# Altium footprint library Elettronica FM.PcbLib: 387 footprints (part 4 of 25)
Each footprint in its own frame and in the unit in brackets; x right, y up, seen from the top. Pads: shape width x height; smd on the part's side, far side on the other; paste and mask are expansions set on the pad; w line width, h text height; cw(c..) or ccw(c..) is an arc to the next point about the centre after c.
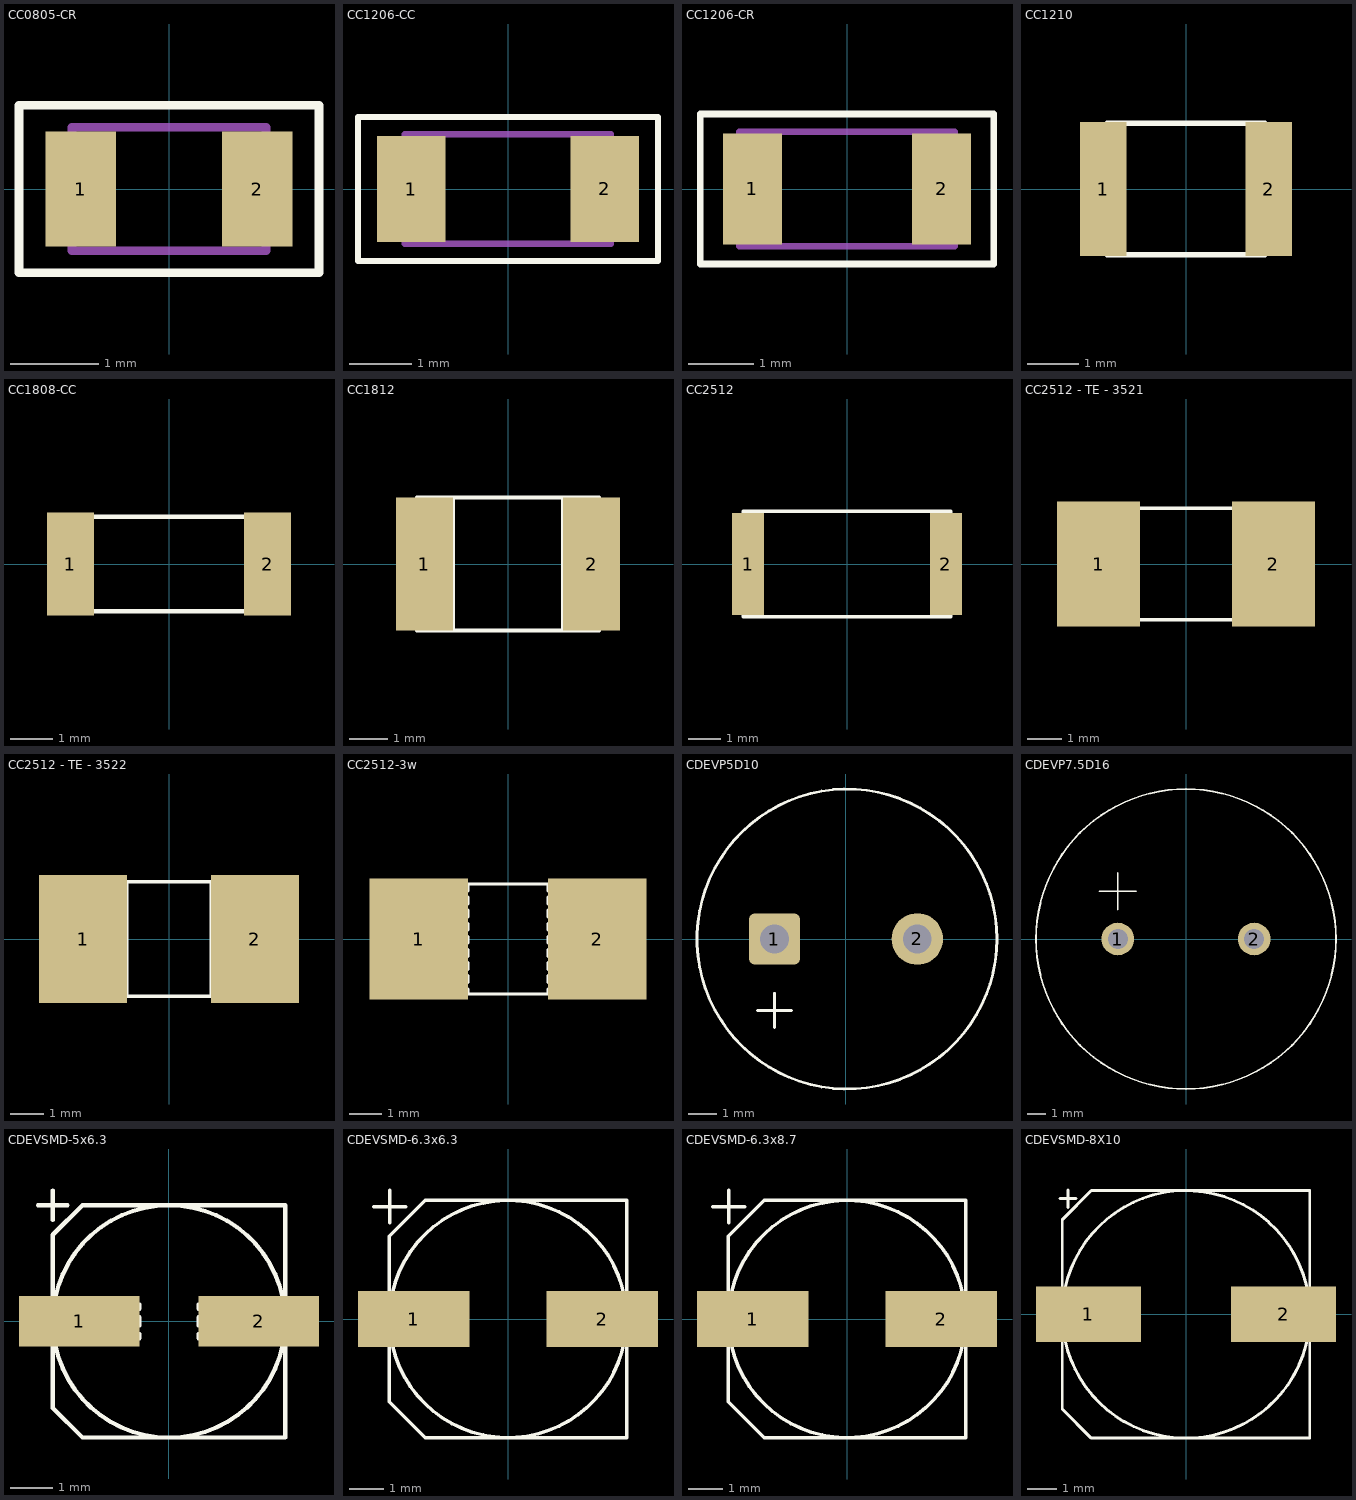
[diagram p3: the footprints below, top view; thin cyan lines are the x and y axes]

## CC0805-CR [mm]
height 1.9
pads (2):
  rect 0.8x1.3 smd paste-5: 1(-1,0) 2(1,0)
Top Overlay:
  lines w0.1: -1.7,-0.95 -1.7,0.95 1.7,0.95 1.7,-0.95 -1.7,-0.95
Top Paste:
  region: 1.35,0.6 0.9,0.6 0.65,0 0.9,-0.6 1.35,-0.6
  region: -1.35,0.6 -0.9,0.6 -0.65,0 -0.9,-0.6 -1.35,-0.6
Mechanical 3:
  lines w0.1: -1.1,-0.7 -1.1,0.7 1.1,0.7 1.1,-0.7 -1.1,-0.7
3D body "res0805.STEP": height 0.5, standoff 0, extent -1,-0.625 1,0.625

## CC1206-CC [mm]
height 1.9
pads (2):
  rect 1.1x1.7 smd paste-5: 1(-1.55,0) 2(1.55,0)
Top Overlay:
  lines w0.1: -2.4,-1.15 2.4,-1.15 2.4,1.15 -2.4,1.15 -2.4,-1.15
Top Paste:
  region: 2.05,0.8 1.3,0.8 1.05,0 1.3,-0.8 2.05,-0.8
  region: -2.05,0.8 -1.3,0.8 -1.05,0 -1.3,-0.8 -2.05,-0.8
Mechanical 3:
  lines w0.1: -1.65,-0.875 -1.65,0.875 1.65,0.875 1.65,-0.875 -1.65,-0.875
3D body "res1206r.STEP": height 0.55, standoff 0, extent -1.55,-0.8 1.55,0.8

## CC1206-CR [mm]
height 1.9
pads (2):
  rect 0.9x1.7 smd paste-5: 1(-1.45,0) 2(1.45,0)
Top Overlay:
  lines w0.1: -2.25,-1.15 -2.25,1.15 2.25,1.15 2.25,-1.15 -2.25,-1.15
Top Paste:
  region: 1.85,0.6 1.85,0.8 1.3,0.8 1.05,0 1.3,-0.8 1.85,-0.8 1.85,-0.6
  region: -1.85,0.6 -1.85,0.8 -1.3,0.8 -1.05,0 -1.3,-0.8 -1.85,-0.8 -1.85,-0.6
Mechanical 3:
  lines w0.1: -1.65,-0.875 1.65,-0.875 1.65,0.875 -1.65,0.875 -1.65,-0.875
3D body "res1206r.STEP": height 0.55, standoff 0, extent -1.525,-0.85 1.575,0.75

## CC1210 [mm]
pads (2):
  rect 0.9x2.6 smd: 1(-1.6,0) 2(1.6,0)
Top Overlay:
  lines w0.1: -1.525,-1.27 1.525,-1.27 1.525,1.27 -1.525,1.27 -1.525,-1.27

## CC1808-CC [mm]
pads (2):
  rect 1.1x2.4 smd: 1(-2.3,0) 2(2.3,0)
Top Overlay:
  lines w0.1: -2.1,-1.1 -2.1,1.1 ; 2.1,-1.1 2.1,1.1 ; -2.4,-1.1 2.4,-1.1 2.4,1.1 -2.4,1.1 -2.4,-1.1

## CC1812 [mm]
pads (2):
  rect 1.5x3.5 smd: 1(-2.2,0) 2(2.2,0)
Top Overlay:
  lines w0.1: -1.45,-1.75 -1.45,1.75 ; 1.45,-1.75 1.45,1.75 ; -2.4,-1.75 -2.4,1.75 2.4,1.75 2.4,-1.75 -2.4,-1.75

## CC2512 [mm]
pads (2):
  rect 1x3.2 smd: 1(-3.1,0) 2(3.1,0)
Top Overlay:
  lines w0.1: -3.25,-1.65 3.25,-1.65 3.25,1.65 -3.25,1.65 -3.25,-1.65

## CC2512 - TE - 3521 [mm]
pads (2):
  rect 2.45x3.7 smd: 1(-2.575,0) 2(2.575,0)
Top Overlay:
  lines w0.1: -3.25,-1.65 3.25,-1.65 3.25,1.65 -3.25,1.65 -3.25,-1.65

## CC2512 - TE - 3522 [mm]
pads (2):
  rect 2.6x3.8 smd: 1(-2.55,0) 2(2.55,0)
Top Overlay:
  lines w0.1: -1.25,-1.65 -1.25,1.65 ; 1.25,-1.65 1.25,1.65 ; -3.25,-1.7 3.25,-1.7 3.25,1.7 -3.25,1.7 -3.25,-1.7

## CC2512-3w [mm]
pads (2):
  rect 3x3.7 smd: 1(-2.725,0) 2(2.725,0)
Top Overlay:
  lines w0.1: -1.225,-1.675 -1.225,-1.525 ; -1.225,-1.325 -1.225,-1.125 ; -1.225,-0.925 -1.225,-0.725 ; -1.225,-0.525 -1.225,-0.325 ; -1.225,-0.125 -1.225,0.075 ; -1.225,0.275 -1.225,0.475 ; -1.225,0.675 -1.225,0.875 ; -1.225,1.075 -1.225,1.275 ; -1.225,1.475 -1.225,1.675 ; 1.225,-1.675 1.225,-1.525 ; 1.225,-1.325 1.225,-1.125 ; 1.225,-0.925 1.225,-0.725 ; 1.225,-0.525 1.225,-0.325 ; 1.225,-0.125 1.225,0.075 ; 1.225,0.275 1.225,0.475 ; 1.225,0.675 1.225,0.875 ; 1.225,1.075 1.225,1.275 ; 1.225,1.475 1.225,1.675 ; -3.225,-1.675 -3.225,1.675 3.225,1.675 3.225,-1.675 -3.225,-1.675

## CDEVP5D10 [mm]
height 8.5
pads (2):
  rrect25% 1.8x1.8 hole 1: 1(-2.5,0)
  round 1.8 hole 1: 2(2.5,0)
Top Overlay:
  circle w0.1: c0.038,0 r5.25
  lines w0.1: -3.1,-2.5 -1.9,-2.5 ; -2.5,-3.1 -2.5,-1.9
3D body: height 17.5, standoff 0, extent -5.25,-5.247 5.25,5.247

## CDEVP7.5D16 [mm]
height 40.5
pads (2):
  round 1.8 hole 1.1: 1(-3.75,0) 2(3.75,0)
Top Overlay:
  circle w0.1: c0,0 r8.25
  lines w0.1: -4.75,2.625 -2.75,2.625 ; -3.75,1.625 -3.75,3.625
3D body: height 0, standoff -3, extent 3.353,-0.399 4.15,0.399
3D body: height 0, standoff -3, extent -4.147,-0.399 -3.35,0.399
3D body: height 26.7, standoff -0.1, extent 6.3,-1 8.25,1
3D body: height 26.5, standoff 0, extent -8.25,-8.247 8.25,8.247
3D body: height 26.6, standoff -0.1, extent -6.3,-6.3 6.3,6.3

## CDEVSMD-5x6.3 [mm]
height 1.9
pads (2):
  rect 2.85x1.2 smd: 1(-2.125,0) 2(2.125,0)
Top Overlay:
  circle w0.1: c0,0 r2.75
  lines w0.1: -3.1,2.75 -2.4,2.75 ; -2.75,-0.4 -3.05,-0.4 -3.05,0.4 -2.75,0.4 ; -2.75,2.4 -2.75,3.1 ; -2.5,-0.4 -2.3,-0.4 ; -2.5,0.4 -2.3,0.4 ; -2.1,-0.4 -1.9,-0.4 ; -2.1,0.4 -1.9,0.4 ; -1.7,-0.4 -1.5,-0.4 ; -1.7,0.4 -1.5,0.4 ; -1.3,-0.4 -1.1,-0.4 ; -1.3,0.4 -1.1,0.4 ; -0.9,-0.4 -0.7,-0.4 -0.7,-0.3 ; -0.9,0.4 -0.7,0.4 -0.7,0.3 ; -0.7,-0.1 -0.7,0.1 ; 0.7,-0.3 0.7,-0.4 0.9,-0.4 ; 0.7,-0.1 0.7,0.1 ; 0.7,0.3 0.7,0.4 0.9,0.4 ; 1.1,-0.4 1.3,-0.4 ; 1.1,0.4 1.3,0.4 ; 1.5,-0.4 1.7,-0.4 ; 1.5,0.4 1.7,0.4 ; 1.9,-0.4 2.1,-0.4 ; 1.9,0.4 2.1,0.4 ; 2.3,-0.4 2.5,-0.4 ; 2.3,0.4 2.5,0.4 ; 2.75,-0.4 3.05,-0.4 3.05,0.4 2.75,0.4 ; -2.75,-2.05 -2.05,-2.75 2.75,-2.75 2.75,2.75 -2.05,2.75 -2.75,2.05 -2.75,-2.05
3D body: height 6.1, standoff 0, extent -2.75,-2.75 2.75,2.75
3D body: height 1, standoff 0, extent -2.75,-2.75 2.75,2.75

## CDEVSMD-6.3x6.3 [mm]
height 1.9
pads (2):
  rect 3.2x1.6 smd: 1(-2.7,0) 2(2.7,0)
Top Overlay:
  circle w0.1: c0,0 r3.4
  lines w0.1: -3.85,3.225 -2.925,3.225 ; -3.4,-0.4 -3.9,-0.4 -3.9,0.4 -3.4,0.4 ; -3.387,2.762 -3.387,3.687 ; 3.4,-0.4 3.9,-0.4 3.9,0.4 3.4,0.4 ; -3.4,-2.375 -2.375,-3.4 3.4,-3.4 3.4,3.4 -2.375,3.4 -3.4,2.375 -3.4,-2.375
3D body: height 1, standoff 0, extent -3.4,-3.4 3.4,3.4
3D body: height 6.8, standoff 0, extent -3.4,-3.4 3.4,3.4

## CDEVSMD-6.3x8.7 [mm]
height 1.9
pads (2):
  rect 3.2x1.6 smd: 1(-2.7,0) 2(2.7,0)
Top Overlay:
  circle w0.1: c0,0 r3.4
  lines w0.1: -3.85,3.225 -2.925,3.225 ; -3.4,-0.4 -3.9,-0.4 -3.9,0.4 -3.4,0.4 ; -3.387,2.762 -3.387,3.687 ; 3.4,-0.4 3.9,-0.4 3.9,0.4 3.4,0.4 ; -3.4,-2.375 -3.4,2.375 -2.375,3.4 3.4,3.4 3.4,-3.4 -2.375,-3.4 -3.4,-2.375
3D body: height 9.2, standoff 0, extent -3.4,-3.4 3.4,3.4
3D body: height 1, standoff 0, extent -3.4,-3.4 3.4,3.4

## CDEVSMD-8X10 [mm]
pads (2):
  rect 3.6x1.9 smd: 1(-3.35,0) 2(3.35,0)
Top Overlay:
  circle w0.1: c0,0 r4.25
  lines w0.1: -4.325,3.975 -3.775,3.975 ; -4.25,-0.55 -4.75,-0.55 -4.75,0.55 -4.25,0.55 ; -4.05,3.675 -4.05,4.275 ; 4.25,-0.55 4.75,-0.55 4.75,0.55 4.25,0.55 ; -4.25,-3.25 -4.25,3.25 -3.25,4.25 4.25,4.25 4.25,-4.25 -3.25,-4.25 -4.25,-3.25
3D body: height 10.5, standoff 0, extent -4.25,-4.25 4.25,4.25
3D body: height 1, standoff 0, extent -4.25,-4.25 4.25,4.25